# Altium footprint library Connectors THD.PcbLib: 631 footprints (part 8 of 46)
Each footprint in its own frame and in the unit in brackets; x right, y up, seen from the top. Pads: shape width x height; smd on the part's side, far side on the other; paste and mask are expansions set on the pad; w line width, h text height; cw(c..) or ccw(c..) is an arc to the next point about the centre after c.
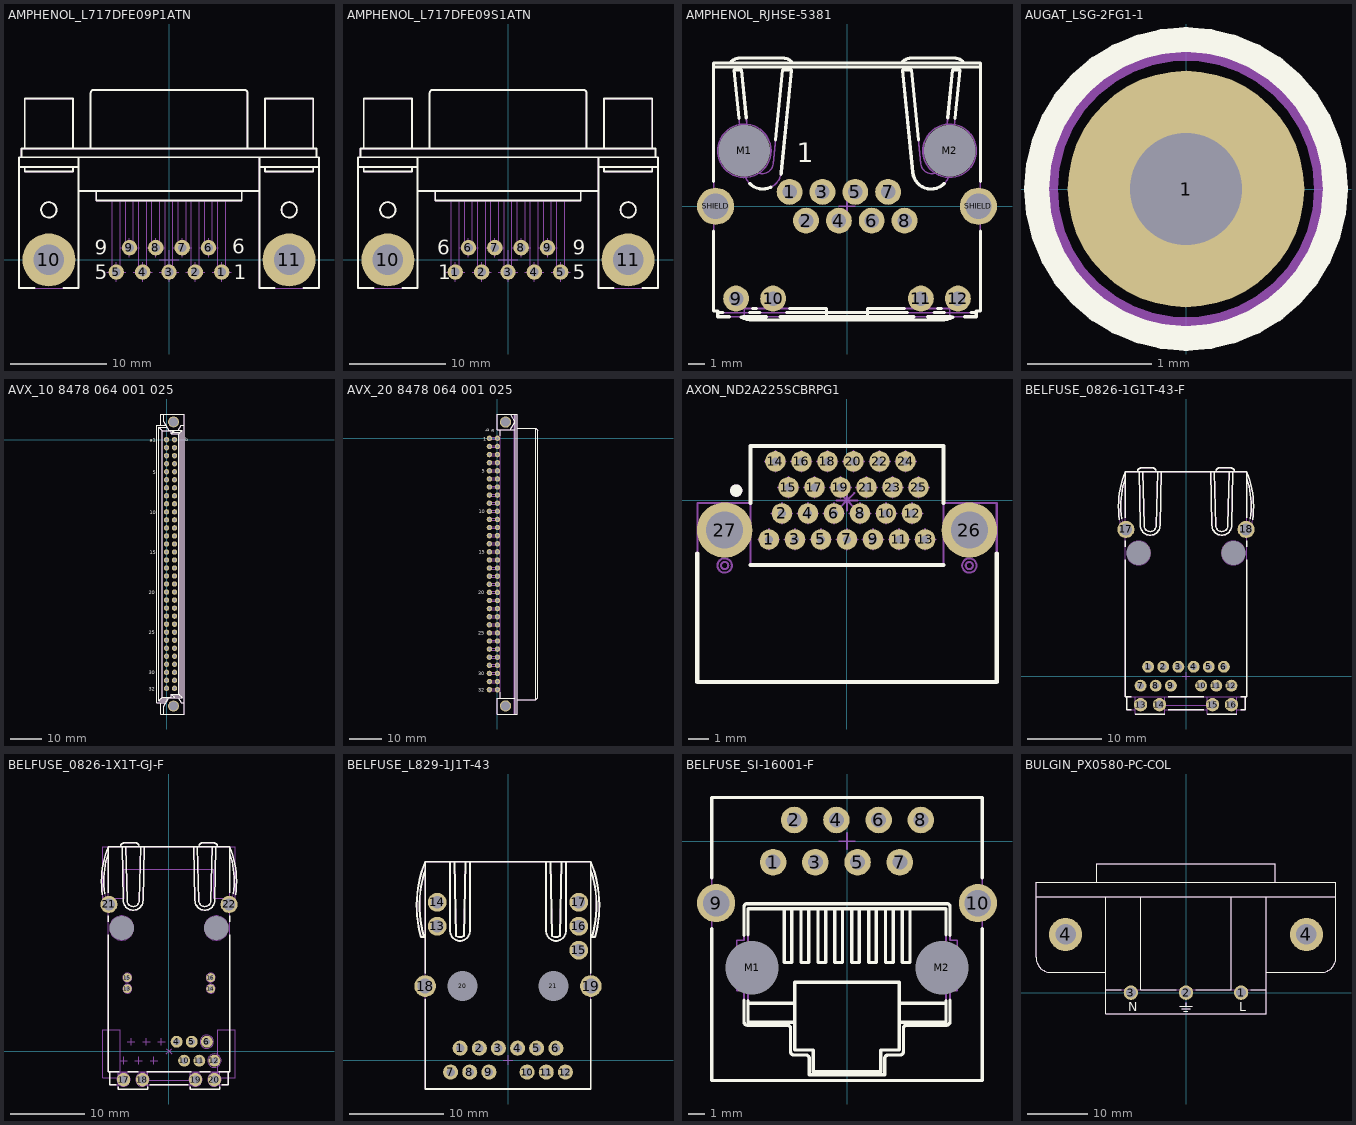
[diagram p7: the footprints below, top view; thin cyan lines are the x and y axes]

## AMPHENOL_L717DFE09P1ATN [mm] "Right Angled D-Sub 9 Male Contacts with Metal Bracket and Front Female Screwlock (UNC4-40)"
height 13.4
pads (11):
  round 1.6 hole 0.9: 1(5.48,-1.27) 2(2.74,-1.27) 3(0,-1.27) 4(-2.74,-1.27) 5(-5.48,-1.27) 6(4.11,1.27) 7(1.37,1.27) 8(-1.37,1.27) 9(-4.11,1.27)
  round 5.5 hole 3.2: 10(-12.495,0) 11(12.495,0)
Top Overlay:
  circle w0.2: c12.5,5.2 r0.8
  circle w0.2: c-12.5,5.2 r0.8
  lines w0.2: -15.35,10.67 -15.35,11.57 15.35,11.57 15.35,10.67 ; -15,9.67 -15,9.17 -10,9.17 -10,9.67 ; -15,11.57 -15,16.77 -10,16.77 -10,11.57 ; -14,-2.93 -15.6,-2.93 -15.6,10.67 15.6,10.67 15.6,-2.93 14,-2.93 ; -11,-2.93 -9.4,-2.93 -9.4,10.67 ; -9.539,9.67 -15.6,9.67 -9.4,9.67 ; -9.4,7.17 9.4,7.17 ; -8.142,11.57 -8.142,17.37 cw(c-7.842,17.37) -7.842,17.67 7.861,17.67 cw(c7.861,17.37) 8.161,17.37 8.161,11.57 ; -7.57,7.17 -7.57,6.17 7.57,6.17 7.57,7.17 ; 9.4,9.67 15.6,9.67 ; 9.4,10.67 9.4,-2.93 11,-2.93 ; 10,9.67 10,9.17 15,9.17 15,9.67 ; 10,11.57 10,16.77 15,16.77 15,11.57
  text "9" at -7.747,0.508 h1.5
  text "1" at 6.731,-2.032 h1.5
  text "5" at -7.747,-2.032 h1.5
  text "6" at 6.604,0.635 h1.5
Mechanical 8:
  lines w0.1: -13.5,0 -12.5,0 ; -12.5,-1 -12.5,0 ; -12.5,1 -12.5,0 ; -11.5,0 -12.5,0 ; -6.48,-1.27 -5.48,-1.27 ; -5.48,-2.27 -5.48,-1.27 ; -5.48,-0.27 -5.48,-1.27 ; -5.11,1.27 -4.11,1.27 ; -4.48,-1.27 -5.48,-1.27 ; -4.11,0.27 -4.11,1.27 ; -4.11,2.27 -4.11,1.27 ; -3.74,-1.27 -2.74,-1.27 ; -3.11,1.27 -4.11,1.27 ; -2.74,-2.27 -2.74,-1.27 ; -2.74,-0.27 -2.74,-1.27 ; -2.37,1.27 -1.37,1.27 ; -1.74,-1.27 -2.74,-1.27 ; -1.37,0.27 -1.37,1.27 ; -1.37,2.27 -1.37,1.27 ; -1,-1.27 0,-1.27 ; -1,0 0,0 ; -0.37,1.27 -1.37,1.27 ; 0,-2.27 0,-1.27 ; 0,-1 0,0 ; 0,-0.27 0,-1.27 ; 0,1 0,0 ; 0.37,1.27 1.37,1.27 ; 1,-1.27 0,-1.27 ; 1,0 0,0 ; 1.37,0.27 1.37,1.27 ; 1.37,2.27 1.37,1.27 ; 1.74,-1.27 2.74,-1.27 ; 2.37,1.27 1.37,1.27 ; 2.74,-2.27 2.74,-1.27 ; 2.74,-0.27 2.74,-1.27 ; 3.11,1.27 4.11,1.27 ; 3.74,-1.27 2.74,-1.27 ; 4.11,0.27 4.11,1.27 ; 4.11,2.27 4.11,1.27 ; 4.48,-1.27 5.48,-1.27 ; 5.11,1.27 4.11,1.27 ; 5.48,-2.27 5.48,-1.27 ; 5.48,-0.27 5.48,-1.27 ; 6.48,-1.27 5.48,-1.27 ; 11.5,0 12.5,0 ; 12.5,-1 12.5,0 ; 12.5,1 12.5,0 ; 13.5,0 12.5,0
Mechanical 14:
  circle w0.1: c12.5,0 r1.6
  circle w0.1: c12.5,5.2 r0.8
  circle w0.1: c-12.5,5.2 r0.8
  circle w0.1: c-12.5,0 r1.6
  lines w0.1: -15.35,10.67 -15.35,11.57 15.35,11.57 15.35,10.67 ; -15,9.67 -15,9.17 -10,9.17 -10,9.67 ; -15,11.57 -15,16.77 -10,16.77 -10,11.57 ; -9.539,9.67 -15.6,9.67 -9.4,9.67 ; -9.4,7.17 9.4,7.17 ; -9.4,10.67 -9.4,-2.93 -15.6,-2.93 -15.6,10.67 15.6,10.67 15.6,-2.93 9.4,-2.93 9.4,10.67 ; -8.142,11.57 -8.142,17.37 cw(c-7.842,17.37) -7.842,17.67 7.861,17.67 cw(c7.861,17.37) 8.161,17.37 8.161,11.57 ; -7.57,7.17 -7.57,6.17 7.57,6.17 7.57,7.17 ; -5.88,6.17 -5.88,-1.27 ccw(c-5.48,-1.27) -5.08,-1.27 -5.08,6.17 ; -4.51,6.17 -4.51,1.27 ccw(c-4.11,1.27) -3.71,1.27 -3.71,6.17 ; -3.14,6.17 -3.14,-1.27 ccw(c-2.74,-1.27) -2.34,-1.27 -2.34,6.17 ; -1.77,6.17 -1.77,1.27 ccw(c-1.37,1.27) -0.97,1.27 -0.97,6.17 ; -0.4,6.17 -0.4,-1.27 ccw(c0,-1.27) 0.4,-1.27 0.4,6.17 ; 0.97,6.17 0.97,1.27 ccw(c1.37,1.27) 1.77,1.27 1.77,6.17 ; 2.34,6.17 2.34,-1.27 ccw(c2.74,-1.27) 3.14,-1.27 3.14,6.17 ; 3.71,6.17 3.71,1.27 ccw(c4.11,1.27) 4.51,1.27 4.51,6.17 ; 5.08,6.17 5.08,-1.27 ccw(c5.48,-1.27) 5.88,-1.27 5.88,6.17 ; 9.4,9.67 15.6,9.67 ; 10,9.67 10,9.17 15,9.17 15,9.67 ; 10,11.57 10,16.77 15,16.77 15,11.57
3D body: height 13.45, standoff -3.95, extent -15.6,-2.93 15.6,17.67

## AMPHENOL_L717DFE09S1ATN [mm] "Right Angled D-Sub 9 Female Contacts with Metal Bracket and Front Female Screwlock (UNC4-40)"
height 13.4
pads (11):
  round 1.6 hole 0.9: 1(-5.48,-1.27) 2(-2.74,-1.27) 3(0,-1.27) 4(2.74,-1.27) 5(5.48,-1.27) 6(-4.11,1.27) 7(-1.37,1.27) 8(1.37,1.27) 9(4.11,1.27)
  round 5.5 hole 3.2: 10(-12.495,0) 11(12.495,0)
Top Overlay:
  circle w0.2: c12.5,5.2 r0.8
  circle w0.2: c-12.5,5.2 r0.8
  lines w0.2: -15.35,10.67 -15.35,11.57 15.35,11.57 15.35,10.67 ; -15,9.67 -15,9.17 -10,9.17 -10,9.67 ; -15,11.57 -15,16.77 -10,16.77 -10,11.57 ; -14,-2.93 -15.6,-2.93 -15.6,10.67 15.6,10.67 15.6,-2.93 14,-2.93 ; -11,-2.93 -9.4,-2.93 -9.4,10.67 ; -9.539,9.67 -15.6,9.67 -9.4,9.67 ; -9.4,7.17 9.4,7.17 ; -8.142,11.57 -8.142,17.37 cw(c-7.842,17.37) -7.842,17.67 7.861,17.67 cw(c7.861,17.37) 8.161,17.37 8.161,11.57 ; -7.57,7.17 -7.57,6.17 7.57,6.17 7.57,7.17 ; 9.4,9.67 15.6,9.67 ; 9.4,10.67 9.4,-2.93 11,-2.93 ; 10,9.67 10,9.17 15,9.17 15,9.67 ; 10,11.57 10,16.77 15,16.77 15,11.57
  text "6" at -7.366,0.508 h1.5
  text "5" at 6.731,-2.032 h1.5
  text "1" at -7.239,-2.032 h1.5
  text "9" at 6.731,0.508 h1.5
Mechanical 8:
  lines w0.1: -13.5,0 -12.5,0 ; -12.5,-1 -12.5,0 ; -12.5,1 -12.5,0 ; -11.5,0 -12.5,0 ; -6.48,-1.27 -5.48,-1.27 ; -5.48,-2.27 -5.48,-1.27 ; -5.48,-0.27 -5.48,-1.27 ; -5.11,1.27 -4.11,1.27 ; -4.48,-1.27 -5.48,-1.27 ; -4.11,0.27 -4.11,1.27 ; -4.11,2.27 -4.11,1.27 ; -3.74,-1.27 -2.74,-1.27 ; -3.11,1.27 -4.11,1.27 ; -2.74,-2.27 -2.74,-1.27 ; -2.74,-0.27 -2.74,-1.27 ; -2.37,1.27 -1.37,1.27 ; -1.74,-1.27 -2.74,-1.27 ; -1.37,0.27 -1.37,1.27 ; -1.37,2.27 -1.37,1.27 ; -1,-1.27 0,-1.27 ; -1,0 0,0 ; -0.37,1.27 -1.37,1.27 ; 0,-2.27 0,-1.27 ; 0,-1 0,0 ; 0,-0.27 0,-1.27 ; 0,1 0,0 ; 0.37,1.27 1.37,1.27 ; 1,-1.27 0,-1.27 ; 1,0 0,0 ; 1.37,0.27 1.37,1.27 ; 1.37,2.27 1.37,1.27 ; 1.74,-1.27 2.74,-1.27 ; 2.37,1.27 1.37,1.27 ; 2.74,-2.27 2.74,-1.27 ; 2.74,-0.27 2.74,-1.27 ; 3.11,1.27 4.11,1.27 ; 3.74,-1.27 2.74,-1.27 ; 4.11,0.27 4.11,1.27 ; 4.11,2.27 4.11,1.27 ; 4.48,-1.27 5.48,-1.27 ; 5.11,1.27 4.11,1.27 ; 5.48,-2.27 5.48,-1.27 ; 5.48,-0.27 5.48,-1.27 ; 6.48,-1.27 5.48,-1.27 ; 11.5,0 12.5,0 ; 12.5,-1 12.5,0 ; 12.5,1 12.5,0 ; 13.5,0 12.5,0
Mechanical 14:
  circle w0.1: c12.5,0 r1.6
  circle w0.1: c12.5,5.2 r0.8
  circle w0.1: c-12.5,5.2 r0.8
  circle w0.1: c-12.5,0 r1.6
  lines w0.1: -15.35,10.67 -15.35,11.57 15.35,11.57 15.35,10.67 ; -15,9.67 -15,9.17 -10,9.17 -10,9.67 ; -15,11.57 -15,16.77 -10,16.77 -10,11.57 ; -9.539,9.67 -15.6,9.67 -9.4,9.67 ; -9.4,7.17 9.4,7.17 ; -9.4,10.67 -9.4,-2.93 -15.6,-2.93 -15.6,10.67 15.6,10.67 15.6,-2.93 9.4,-2.93 9.4,10.67 ; -8.142,11.57 -8.142,17.37 cw(c-7.842,17.37) -7.842,17.67 7.861,17.67 cw(c7.861,17.37) 8.161,17.37 8.161,11.57 ; -7.57,7.17 -7.57,6.17 7.57,6.17 7.57,7.17 ; -5.88,6.17 -5.88,-1.27 ccw(c-5.48,-1.27) -5.08,-1.27 -5.08,6.17 ; -4.51,6.17 -4.51,1.27 ccw(c-4.11,1.27) -3.71,1.27 -3.71,6.17 ; -3.14,6.17 -3.14,-1.27 ccw(c-2.74,-1.27) -2.34,-1.27 -2.34,6.17 ; -1.77,6.17 -1.77,1.27 ccw(c-1.37,1.27) -0.97,1.27 -0.97,6.17 ; -0.4,6.17 -0.4,-1.27 ccw(c0,-1.27) 0.4,-1.27 0.4,6.17 ; 0.97,6.17 0.97,1.27 ccw(c1.37,1.27) 1.77,1.27 1.77,6.17 ; 2.34,6.17 2.34,-1.27 ccw(c2.74,-1.27) 3.14,-1.27 3.14,6.17 ; 3.71,6.17 3.71,1.27 ccw(c4.11,1.27) 4.51,1.27 4.51,6.17 ; 5.08,6.17 5.08,-1.27 ccw(c5.48,-1.27) 5.88,-1.27 5.88,6.17 ; 9.4,9.67 15.6,9.67 ; 10,9.67 10,9.17 15,9.17 15,9.67 ; 10,11.57 10,16.77 15,16.77 15,11.57
3D body: height 13.45, standoff -3.95, extent -15.6,-2.93 15.6,17.67

## AMPHENOL_RJHSE-5381 [mm] "1 Port, 8 Positions, CAT5 RJ45 Modular Connector With Yellow And Green LEDs"
height 13.46
pads (16):
  round 1.6 hole 0.9: 1(-3.554,0.886) 2(-2.538,-0.894) 3(-1.522,0.886) 4(-0.506,-0.894) 5(0.51,0.886) 6(1.526,-0.894) 7(2.542,0.886) 8(3.558,-0.894) 9(-6.862,-5.714) 10(-4.572,-5.714) 11(4.568,-5.714) 12(6.858,-5.714)
  round 1 hole 3.2 unplated mask+1.1: M1(-6.352,3.426) M2(6.348,3.426)
  round 2.3 hole 1.6: SHIELD(-8.132,-0.004) SHIELD(8.128,-0.004)
Top Overlay:
  lines w0.2: -8.257,-1.549 -8.257,-6.478 -8.003,-6.478 -8.003,-6.834 -7.293,-6.834 ; -8.257,1.541 -8.257,8.863 8.253,8.863 8.253,1.541 ; -8.257,8.609 8.253,8.609 ; -8.003,-6.58 -7.693,-6.58 ; -7.242,8.863 cw(c-6.621,8.379) -6.621,9.166 -3.979,9.166 cw(c-3.979,8.379) -3.358,8.863 ; -6.688,5.449 -6.987,8.432 -6.53,8.432 -6.233,5.473 ; -6.54,-6.87 ccw(c-5.844,-5.507) -5.844,-7.037 5.84,-7.037 ccw(c5.84,-5.507) 6.536,-6.87 ; -6.431,-6.834 -5.003,-6.834 ; -6.031,-6.58 -5.403,-6.58 ; -6.022,1.403 ccw(c-5.209,2.214) -4.719,1.176 ; -5.83,-6.326 -5.604,-6.326 ; -4.422,4.118 -3.99,8.432 -3.431,8.432 -4.066,2.1 cw(c-5.209,2.214) -4.089,1.961 ; -4.141,-6.834 4.137,-6.834 ; -3.741,-6.58 3.737,-6.58 ; -3.54,-6.326 -1.272,-6.326 -1.272,-6.834 ; 1.268,-6.834 1.268,-6.326 3.536,-6.326 ; 3.366,8.863 cw(c3.986,8.379) 3.986,9.166 6.628,9.166 cw(c6.628,8.379) 7.249,8.863 ; 4.418,4.118 3.986,8.432 3.427,8.432 4.062,2.1 ccw(c5.205,2.214) 6.018,1.403 ; 4.999,-6.834 6.427,-6.834 ; 5.399,-6.58 6.027,-6.58 ; 5.6,-6.326 5.826,-6.326 ; 6.229,5.473 6.526,8.432 6.983,8.432 6.684,5.449 ; 7.289,-6.834 7.999,-6.834 7.999,-6.478 8.253,-6.478 8.253,-1.549 ; 7.689,-6.58 7.999,-6.58
  text "1" at -3.12,2.725 h1.2
Mechanical 8:
  circle w0.1: c2.542,0.886 r0.45
  circle w0.1: c0.51,0.886 r0.45
  circle w0.1: c-1.522,0.886 r0.45
  circle w0.1: c-3.554,0.886 r0.45
  circle w0.1: c-2.538,-0.894 r0.45
  circle w0.1: c-0.506,-0.894 r0.45
  circle w0.1: c1.526,-0.894 r0.45
  circle w0.1: c3.558,-0.894 r0.45
  circle w0.1: c-8.132,-0.004 r0.8
  circle w0.1: c8.128,-0.004 r0.8
  circle w0.1: c-6.352,3.426 r1.65
  circle w0.1: c6.348,3.426 r1.65
  lines w0.1: -8.632,-0.004 -8.132,-0.004 ; -8.132,-0.504 -8.132,-0.004 ; -8.132,0.496 -8.132,-0.004 ; -7.632,-0.004 -8.132,-0.004 ; -7.362,-5.714 -6.862,-5.714 ; -6.862,-6.214 -6.862,-5.714 ; -6.862,-5.214 -6.862,-5.714 ; -6.852,3.426 -6.352,3.426 ; -6.362,-5.714 -6.862,-5.714 ; -6.352,2.926 -6.352,3.426 ; -6.352,3.926 -6.352,3.426 ; -5.852,3.426 -6.352,3.426 ; -5.072,-5.714 -4.572,-5.714 ; -4.572,-6.214 -4.572,-5.714 ; -4.572,-5.214 -4.572,-5.714 ; -4.072,-5.714 -4.572,-5.714 ; -4.054,0.886 -3.554,0.886 ; -3.554,0.386 -3.554,0.886 ; -3.554,1.386 -3.554,0.886 ; -3.054,0.886 -3.554,0.886 ; -3.038,-0.894 -2.538,-0.894 ; -2.538,-1.394 -2.538,-0.894 ; -2.538,-0.394 -2.538,-0.894 ; -2.038,-0.894 -2.538,-0.894 ; -2.022,0.886 -1.522,0.886 ; -1.522,0.386 -1.522,0.886 ; -1.522,1.386 -1.522,0.886 ; -1.022,0.886 -1.522,0.886 ; -1.006,-0.894 -0.506,-0.894 ; -0.506,-1.394 -0.506,-0.894 ; -0.506,-0.394 -0.506,-0.894 ; -0.5,0 0,0 ; -0.006,-0.894 -0.506,-0.894 ; 0,-0.5 0,0 ; 0,0.5 0,0 ; 0.01,0.886 0.51,0.886 ; 0.5,0 0,0 ; 0.51,0.386 0.51,0.886 ; 0.51,1.386 0.51,0.886 ; 1.01,0.886 0.51,0.886 ; 1.026,-0.894 1.526,-0.894 ; 1.526,-1.394 1.526,-0.894 ; 1.526,-0.394 1.526,-0.894 ; 2.026,-0.894 1.526,-0.894 ; 2.042,0.886 2.542,0.886 ; 2.542,0.386 2.542,0.886 ; 2.542,1.386 2.542,0.886 ; 3.042,0.886 2.542,0.886 ; 3.058,-0.894 3.558,-0.894 ; 3.558,-1.394 3.558,-0.894 ; 3.558,-0.394 3.558,-0.894 ; 4.058,-0.894 3.558,-0.894 ; 4.068,-5.714 4.568,-5.714 ; 4.568,-6.214 4.568,-5.714 ; 4.568,-5.214 4.568,-5.714 ; 5.068,-5.714 4.568,-5.714 ; 5.848,3.426 6.348,3.426 ; 6.348,2.926 6.348,3.426 ; 6.348,3.926 6.348,3.426 ; 6.358,-5.714 6.858,-5.714 ; 6.848,3.426 6.348,3.426 ; 6.858,-6.214 6.858,-5.714 ; 6.858,-5.214 6.858,-5.714 ; 7.358,-5.714 6.858,-5.714 ; 7.628,-0.004 8.128,-0.004 ; 8.128,-0.504 8.128,-0.004 ; 8.128,0.496 8.128,-0.004 ; 8.628,-0.004 8.128,-0.004
Mechanical 14:
  lines w0.1: -8.257,-0.408 cw(c-7.884,-0.027) -8.257,0.354 ; -8.257,8.609 8.253,8.609 ; -8.003,-6.58 7.999,-6.58 ; -7.242,8.863 cw(c-6.621,8.379) -6.621,9.166 -3.979,9.166 cw(c-3.979,8.379) -3.358,8.863 ; -6.606,-6.834 ccw(c-5.844,-5.507) -5.844,-7.037 5.84,-7.037 ccw(c5.84,-5.507) 6.602,-6.834 ; -6.352,-6.834 -6.352,-6.326 -1.272,-6.326 -1.272,-6.834 ; 1.268,-6.834 1.268,-6.326 6.348,-6.326 6.348,-6.834 ; 3.366,8.863 cw(c3.986,8.379) 3.986,9.166 6.628,9.166 cw(c6.628,8.379) 7.249,8.863 ; 8.253,-0.408 ccw(c7.88,-0.027) 8.253,0.354 ; -8.257,-6.478 -8.257,8.863 8.253,8.863 8.253,-6.478 7.999,-6.478 7.999,-6.834 -8.003,-6.834 -8.003,-6.478 -8.257,-6.478 ; -6.987,8.432 -6.53,8.432 -5.948,2.63 ccw(c-5.26,2.697) -4.572,2.63 -3.99,8.432 -3.431,8.432 -4.066,2.1 cw(c-5.209,2.214) -6.352,2.1 -6.987,8.432 ; 3.427,8.432 3.986,8.432 4.568,2.63 ccw(c5.256,2.697) 5.944,2.63 6.526,8.432 6.983,8.432 6.348,2.1 cw(c5.205,2.214) 4.062,2.1 3.427,8.432
  text "1" at -3.12,2.725 h1.2
3D body: height 15.14, standoff -3.7, extent -8.417,-7.037 8.413,9.166

## AUGAT_LSG-2FG1-1 [mm] "Single Lead Socket - Wire-Wrap Termination"
height 7.7
pads (1):
  round 1.9 / inner round 1.5 / far side round 1.5 hole 0.9: 1(0,0)
Top Overlay:
  circle w0.2: c0,0 r1.2
Mechanical 14:
  circle w0.1: c0,0 r1.08
Mechanical 15:
  circle w0.05: c0,0 r1.205
3D body: height 7.72, standoff -12.93, extent -1.079,-1.079 1.08,1.08

## AVX_10 8478 064 001 025 [mm] "DIN 41612, Type Q, Thru-Hole Press-Fit Terminations; Rows a+b, 64 Position, Performance level 2, Lead 5.3mm, Straight Male Connector"
height 11.48
pads (66):
  round 1.7 hole 1: a1(0,0) a2(0,-2.54) a3(0,-5.08) a4(0,-7.62) a5(0,-10.16) a6(0,-12.7) a7(0,-15.24) a8(0,-17.78) a9(0,-20.32) a10(0,-22.86) a11(0,-25.4) a12(0,-27.94) a13(0,-30.48) a14(0,-33.02) a15(0,-35.56) a16(0,-38.1) a17(0,-40.64) a18(0,-43.18) a19(0,-45.72) a20(0,-48.26) a21(0,-50.8) a22(0,-53.34) a23(0,-55.88) a24(0,-58.42) a25(0,-60.96) a26(0,-63.5) a27(0,-66.04) a28(0,-68.58) a29(0,-71.12) a30(0,-73.66) a31(0,-76.2) a32(0,-78.74) b1(2.54,0) b2(2.54,-2.54) b3(2.54,-5.08) b4(2.54,-7.62) b5(2.54,-10.16) b6(2.54,-12.7) b7(2.54,-15.24) b8(2.54,-17.78) b9(2.54,-20.32) b10(2.54,-22.86) b11(2.54,-25.4) b12(2.54,-27.94) b13(2.54,-30.48) b14(2.54,-33.02) b15(2.54,-35.56) b16(2.54,-38.1) b17(2.54,-40.64) b18(2.54,-43.18) b19(2.54,-45.72) b20(2.54,-48.26) b21(2.54,-50.8) b22(2.54,-53.34) b23(2.54,-55.88) b24(2.54,-58.42) b25(2.54,-60.96) b26(2.54,-63.5) b27(2.54,-66.04) b28(2.54,-68.58) b29(2.54,-71.12) b30(2.54,-73.66) b31(2.54,-76.2) b32(2.54,-78.74)
  round 3.5 / inner round 3.5 / far side round 5.1 hole 2.8: MTG1(2.24,5.63) MTG2(2.24,-84.37)
Top Overlay:
  lines w0.2: -1.83,-83.32 -1.83,-86.87 5.57,-86.87 5.57,8.13 -1.83,8.13 -1.83,4.58 ; -1.83,-81.97 0.576,-81.97 ; -0.81,-86.87 -0.81,-84.37 0.749,-81.67 5.02,-81.67 ; -0.81,8.13 -0.81,5.63 0.749,2.93 5.02,2.93 ; -0.204,-83.32 -3.03,-83.32 -3.03,4.58 -0.204,4.58 ; 0.2,-82.62 -2.48,-82.62 ; 0.2,3.88 -2.48,3.88 ; 1.97,-81.02 4.37,-81.02 4.37,2.28 1.97,2.28 1.97,2.93 ; 2.62,-81.67 1.52,-80.57 ; 2.62,2.93 1.52,1.83 ; 3.731,-81.67 4.684,-83.32 5.57,-83.323 ; 3.731,2.93 4.684,4.58 5.57,4.58 ; -2.48,-82.62 -2.48,3.88 ; -2.48,-82.62 -1.38,-81.52 ; -2.48,3.88 -1.38,2.78 ; -1.38,-81.52 -1.38,2.78 ; -1.38,-81.52 1.52,-81.52 1.52,-80.57 ; -1.38,2.78 1.52,2.78 1.52,1.83 ; 1.52,-80.57 3.92,-80.57 ; 1.52,1.83 3.92,1.83 ; 3.92,-80.57 3.92,1.83 ; 3.92,-80.57 5.02,-81.67 ; 3.92,1.83 5.02,2.93 ; 5.02,-81.67 5.02,2.93
  text "b" at 5.945,-0.574 h1.2
  text "32" at -5.575,-79.44 h1.2
  text "5" at -4.35,-10.91 h1.2
  text "10" at -5.275,-23.56 h1.2
  text "30" at -5.575,-74.36 h1.2
  text "25" at -5.575,-61.66 h1.2
  text "20" at -5.575,-48.96 h1.2
  text "15" at -5.275,-36.26 h1.2
  text "a1" at -5.325,-0.625 h1.2
Mechanical 8:
  drawing of 268 lines, arcs and shapes, not listed
Mechanical 14:
  circle w0.1: c2.24,5.63 r1.27
  circle w0.1: c2.24,-84.37 r1.27
  lines w0.1: -1.83,-83.32 -1.83,-86.87 5.57,-86.87 5.57,8.13 -1.83,8.13 -1.83,4.58 ; -1.83,-81.97 0.576,-81.97 ; -0.81,-86.87 -0.81,-84.37 0.749,-81.67 5.02,-81.67 ; -0.81,8.13 -0.81,5.63 0.749,2.93 5.02,2.93 ; -0.204,-83.32 -3.03,-83.32 -3.03,4.58 -0.204,4.58 ; 0.2,-82.62 -2.48,-82.62 ; 0.2,3.88 -2.48,3.88 ; 1.97,-81.02 4.37,-81.02 4.37,2.28 1.97,2.28 1.97,2.93 ; 2.62,-81.67 1.52,-80.57 ; 2.62,2.93 1.52,1.83 ; 3.731,-81.67 4.684,-83.32 5.57,-83.323 ; 3.731,2.93 4.684,4.58 5.57,4.58 ; -2.48,-82.62 -2.48,3.88 ; -2.48,-82.62 -1.38,-81.52 ; -2.48,3.88 -1.38,2.78 ; -1.38,-81.52 -1.38,2.78 ; -1.38,-81.52 1.52,-81.52 1.52,-80.57 ; -1.38,2.78 1.52,2.78 1.52,1.83 ; 1.52,-80.57 3.92,-80.57 ; 1.52,1.83 3.92,1.83 ; 3.92,-80.57 3.92,1.83 ; 3.92,-80.57 5.02,-81.67 ; 3.92,1.83 5.02,2.93 ; 5.02,-81.67 5.02,2.93
  text "a1" at -5.325,-0.625 h1.2
  text "b" at 5.945,-0.574 h1.2
  text "32" at -5.575,-79.44 h1.2
  text "5" at -4.35,-10.91 h1.2
  text "10" at -5.275,-23.56 h1.2
  text "15" at -5.275,-36.26 h1.2
  text "20" at -5.575,-48.96 h1.2
  text "25" at -5.575,-61.66 h1.2
  text "30" at -5.575,-74.36 h1.2
Drill Drawing:
  lines w0.1: 4.27,-57.71 4.27,-80.17 -1.71,-80.17 -1.71,1.43 4.37,1.43 4.37,-19.61
  text "PRESS-FIT TECHNOLOGY diam. 1mm +0.09 -0.06" at 5.34,-56.3 h1
3D body: height 11.6, standoff -5.3, extent -3.03,-86.87 5.57,8.13

## AVX_20 8478 064 001 025 [mm] "DIN 41612, Type Q, Thru-Hole Press-Fit Terminations; Rows a+b, 64 Position, Performance level 2, Lead 5.3mm, Right Angle Female Connector"
height 8
pads (66):
  round 1.7 hole 1: a1(0,0) a2(0,-2.54) a3(0,-5.08) a4(0,-7.62) a5(0,-10.16) a6(0,-12.7) a7(0,-15.24) a8(0,-17.78) a9(0,-20.32) a10(0,-22.86) a11(0,-25.4) a12(0,-27.94) a13(0,-30.48) a14(0,-33.02) a15(0,-35.56) a16(0,-38.1) a17(0,-40.64) a18(0,-43.18) a19(0,-45.72) a20(0,-48.26) a21(0,-50.8) a22(0,-53.34) a23(0,-55.88) a24(0,-58.42) a25(0,-60.96) a26(0,-63.5) a27(0,-66.04) a28(0,-68.58) a29(0,-71.12) a30(0,-73.66) a31(0,-76.2) a32(0,-78.74) b1(-2.54,0) b2(-2.54,-2.54) b3(-2.54,-5.08) b4(-2.54,-7.62) b5(-2.54,-10.16) b6(-2.54,-12.7) b7(-2.54,-15.24) b8(-2.54,-17.78) b9(-2.54,-20.32) b10(-2.54,-22.86) b11(-2.54,-25.4) b12(-2.54,-27.94) b13(-2.54,-30.48) b14(-2.54,-33.02) b15(-2.54,-35.56) b16(-2.54,-38.1) b17(-2.54,-40.64) b18(-2.54,-43.18) b19(-2.54,-45.72) b20(-2.54,-48.26) b21(-2.54,-50.8) b22(-2.54,-53.34) b23(-2.54,-55.88) b24(-2.54,-58.42) b25(-2.54,-60.96) b26(-2.54,-63.5) b27(-2.54,-66.04) b28(-2.54,-68.58) b29(-2.54,-71.12) b30(-2.54,-73.66) b31(-2.54,-76.2) b32(-2.54,-78.74)
  round 3.5 / inner round 3.5 / far side round 5.1 hole 2.8: MTG1(2.54,5.08) MTG2(2.54,-83.82)
Top Overlay:
  lines w0.2: 0.94,-81.37 0.94,-79.564 ; 0.94,0.824 0.94,2.63 ; 3.955,7.63 5.427,5.08 4.012,2.63 ; 5.59,-86.37 5.59,7.63 ; 5.59,-81.37 -0.06,-81.37 -0.06,-86.37 6.19,-86.37 6.19,7.63 -0.06,7.63 -0.06,2.63 5.59,2.63 ; 6.19,-81.87 12.04,-81.87 ; 6.19,3.13 12.04,3.13 ; 12.04,-81.87 12.64,-81.27 12.64,2.53 12.04,3.13 ; 12.04,-81.87 12.04,3.13
  text "1" at -4.505,-0.725 h1.2
  text "b" at -2.65,2.025 h1.2
  text "a" at -0.95,1.99 h1.2
  text "32" at -5.955,-79.365 h1.2
  text "5" at -4.855,-10.785 h1.2
  text "10" at -5.83,-23.535 h1.2
  text "15" at -5.83,-36.235 h1.2
  text "20" at -6.055,-48.81 h1.2
  text "25" at -6,-61.575 h1.2
  text "30" at -5.98,-74.285 h1.2
Mechanical 8:
  drawing of 266 lines, arcs and shapes, not listed
  text "PCB" at 5.08,-41.275 h1.2
Mechanical 14:
  circle w0.1: c2.54,5.08 r1.27
  circle w0.1: c2.54,-83.82 r1.27
  lines w0.1: 0.94,-81.37 0.94,2.63 ; 0.94,-79.04 -2.84,-79.04 -2.84,-78.44 0.94,-78.44 ; 0.94,-76.5 -2.84,-76.5 -2.84,-75.9 0.94,-75.9 ; 0.94,-73.96 -2.84,-73.96 -2.84,-73.36 0.94,-73.36 ; 0.94,-71.42 -2.84,-71.42 -2.84,-70.82 0.94,-70.82 ; 0.94,-68.88 -2.84,-68.88 -2.84,-68.28 0.94,-68.28 ; 0.94,-66.34 -2.84,-66.34 -2.84,-65.74 0.94,-65.74 ; 0.94,-63.8 -2.84,-63.8 -2.84,-63.2 0.94,-63.2 ; 0.94,-61.26 -2.84,-61.26 -2.84,-60.66 0.94,-60.66 ; 0.94,-58.72 -2.84,-58.72 -2.84,-58.12 0.94,-58.12 ; 0.94,-56.18 -2.84,-56.18 -2.84,-55.58 0.94,-55.58 ; 0.94,-53.64 -2.84,-53.64 -2.84,-53.04 0.94,-53.04 ; 0.94,-51.1 -2.84,-51.1 -2.84,-50.5 0.94,-50.5 ; 0.94,-48.56 -2.84,-48.56 -2.84,-47.96 0.94,-47.96 ; 0.94,-46.02 -2.84,-46.02 -2.84,-45.42 0.94,-45.42 ; 0.94,-43.48 -2.84,-43.48 -2.84,-42.88 0.94,-42.88 ; 0.94,-40.94 -2.84,-40.94 -2.84,-40.34 0.94,-40.34 ; 0.94,-38.4 -2.84,-38.4 -2.84,-37.8 0.94,-37.8 ; 0.94,-35.86 -2.84,-35.86 -2.84,-35.26 0.94,-35.26 ; 0.94,-33.32 -2.84,-33.32 -2.84,-32.72 0.94,-32.72 ; 0.94,-30.78 -2.84,-30.78 -2.84,-30.18 0.94,-30.18 ; 0.94,-28.24 -2.84,-28.24 -2.84,-27.64 0.94,-27.64 ; 0.94,-25.7 -2.84,-25.7 -2.84,-25.1 0.94,-25.1 ; 0.94,-23.16 -2.84,-23.16 -2.84,-22.56 0.94,-22.56 ; 0.94,-20.62 -2.84,-20.62 -2.84,-20.02 0.94,-20.02 ; 0.94,-18.08 -2.84,-18.08 -2.84,-17.48 0.94,-17.48 ; 0.94,-15.54 -2.84,-15.54 -2.84,-14.94 0.94,-14.94 ; 0.94,-13 -2.84,-13 -2.84,-12.4 0.94,-12.4 ; 0.94,-10.46 -2.84,-10.46 -2.84,-9.86 0.94,-9.86 ; 0.94,-7.92 -2.84,-7.92 -2.84,-7.32 0.94,-7.32 ; 0.94,-5.38 -2.84,-5.38 -2.84,-4.78 0.94,-4.78 ; 0.94,-2.84 -2.84,-2.84 -2.84,-2.24 0.94,-2.24 ; 0.94,-0.3 -2.84,-0.3 -2.84,0.3 0.94,0.3 ; 3.955,7.63 5.427,5.08 4.012,2.63 ; 5.59,-86.37 5.59,7.63 ; 5.59,-81.37 -0.06,-81.37 -0.06,-86.37 6.19,-86.37 6.19,7.63 -0.06,7.63 -0.06,2.63 5.59,2.63 ; 6.19,-81.87 12.04,-81.87 ; 6.19,3.13 12.04,3.13 ; 12.04,-81.87 12.64,-81.27 12.64,2.53 12.04,3.13 ; 12.04,-81.87 12.04,3.13
  text "a" at -0.95,1.99 h1.2
  text "b" at -2.65,2.025 h1.2
  text "32" at -5.955,-79.365 h1.2
  text "10" at -5.83,-23.535 h1.2
  text "20" at -6.055,-48.81 h1.2
  text "30" at -5.98,-74.285 h1.2
  text "1" at -4.505,-0.725 h1.2
  text "5" at -4.855,-10.785 h1.2
Drill Drawing:
  lines w0.1: 1.73,-57.71 1.73,-80.17 -4.25,-80.17 -4.25,1.43 1.83,1.43 1.83,-19.61
  text "PRESS-FIT TECHNOLOGY diam. 1mm +0.09 -0.06" at 2.8,-56.3 h1
3D body: height 6.78, standoff -5.3, extent -2.84,-86.37 12.64,7.63

## AXON_ND2A225SCBRPG1 [mm] "AXON Nano-D 2 Row Right Angle PCB Receptacle With Threaded Hole #0-80 UNF"
height 3.82
pads (27):
  round 1 hole 0.4: 1(-3.81,-1.905) 2(-3.175,-0.635) 3(-2.54,-1.905) 4(-1.905,-0.635) 5(-1.27,-1.905) 6(-0.635,-0.635) 7(0,-1.905) 8(0.635,-0.635) 9(1.27,-1.905) 10(1.905,-0.635) 11(2.54,-1.905) 12(3.175,-0.635) 13(3.81,-1.905) 14(-3.493,1.905) 15(-2.858,0.635) 16(-2.222,1.905) 17(-1.587,0.635) 18(-0.953,1.905) 19(-0.318,0.635) 20(0.318,1.905) 21(0.953,0.635) 22(1.587,1.905) 23(2.222,0.635) 24(2.858,1.905) 25(3.493,0.635)
  round 2.7 hole 1.8: 26(5.969,-1.448) 27(-5.968,-1.448)
Top Overlay:
  circle w0.3: c-5.408,0.478 r0.15
  lines w0.2: -7.304,-2.6 -7.304,-8.868 7.306,-8.868 7.306,-2.6 ; -4.704,-3.148 4.701,-3.148 ; -4.699,-0.128 -4.699,2.662 ; 4.701,-0.128 4.701,2.662 ; -4.699,2.662 4.701,2.662 ; -4.699,2.662 4.701,2.662
Mechanical 8:
  circle w0.1: c-5.968,-1.448 r0.9
  circle w0.1: c5.969,-1.448 r0.9
  lines w0.1: -6.468,-1.448 -5.968,-1.448 ; -5.968,-1.948 -5.968,-1.448 ; -5.968,-0.948 -5.968,-1.448 ; -5.468,-1.448 -5.968,-1.448 ; -4.31,-1.905 -3.81,-1.905 ; -3.993,1.905 -3.493,1.905 ; -3.81,-2.405 -3.81,-1.905 ; -3.81,-1.405 -3.81,-1.905 ; -3.675,-0.635 -3.175,-0.635 ; -3.493,1.405 -3.493,1.905 ; -3.493,2.405 -3.493,1.905 ; -3.358,0.635 -2.858,0.635 ; -3.31,-1.905 -3.81,-1.905 ; -3.175,-1.135 -3.175,-0.635 ; -3.175,-0.135 -3.175,-0.635 ; -3.04,-1.905 -2.54,-1.905 ; -2.993,1.905 -3.493,1.905 ; -2.858,0.135 -2.858,0.635 ; -2.858,1.135 -2.858,0.635 ; -2.723,1.905 -2.222,1.905 ; -2.675,-0.635 -3.175,-0.635 ; -2.54,-2.405 -2.54,-1.905 ; -2.54,-1.405 -2.54,-1.905 ; -2.405,-0.635 -1.905,-0.635 ; -2.358,0.635 -2.858,0.635 ; -2.222,1.405 -2.222,1.905 ; -2.222,2.405 -2.222,1.905 ; -2.088,0.635 -1.587,0.635 ; -2.04,-1.905 -2.54,-1.905 ; -1.905,-1.135 -1.905,-0.635 ; -1.905,-0.135 -1.905,-0.635 ; -1.77,-1.905 -1.27,-1.905 ; -1.723,1.905 -2.222,1.905 ; -1.587,0.135 -1.587,0.635 ; -1.587,1.135 -1.587,0.635 ; -1.453,1.905 -0.953,1.905 ; -1.405,-0.635 -1.905,-0.635 ; -1.27,-2.405 -1.27,-1.905 ; -1.27,-1.405 -1.27,-1.905 ; -1.135,-0.635 -0.635,-0.635 ; -1.088,0.635 -1.587,0.635 ; -0.953,1.405 -0.953,1.905 ; -0.953,2.405 -0.953,1.905 ; -0.818,0.635 -0.318,0.635 ; -0.77,-1.905 -1.27,-1.905 ; -0.635,-1.135 -0.635,-0.635 ; -0.635,-0.135 -0.635,-0.635 ; -0.5,-1.905 0,-1.905 ; -0.5,0 0,0 ; -0.453,1.905 -0.953,1.905 ; -0.354,-0.354 0,0 ; -0.354,0.354 0,0 ; -0.318,0.135 -0.318,0.635 ; -0.318,1.135 -0.318,0.635 ; -0.183,1.905 0.318,1.905 ; -0.135,-0.635 -0.635,-0.635 ; 0,-2.405 0,-1.905 ; 0,-1.405 0,-1.905 ; 0,-0.5 0,0 ; 0,0.5 0,0 ; 0.135,-0.635 0.635,-0.635 ; 0.182,0.635 -0.318,0.635 ; 0.318,1.405 0.318,1.905 ; 0.318,2.405 0.318,1.905 ; 0.354,-0.354 0,0 ; 0.354,0.354 0,0 ; 0.453,0.635 0.953,0.635 ; 0.5,-1.905 0,-1.905 ; 0.5,0 0,0 ; 0.635,-1.135 0.635,-0.635 ; 0.635,-0.135 0.635,-0.635 ; 0.77,-1.905 1.27,-1.905 ; 0.818,1.905 0.318,1.905 ; 0.953,0.135 0.953,0.635 ; 0.953,1.135 0.953,0.635 ; 1.088,1.905 1.587,1.905 ; 1.135,-0.635 0.635,-0.635 ; 1.27,-2.405 1.27,-1.905 ; 1.27,-1.405 1.27,-1.905 ; 1.405,-0.635 1.905,-0.635 ; 1.453,0.635 0.953,0.635 ; 1.587,1.405 1.587,1.905 ; 1.587,2.405 1.587,1.905 ; 1.723,0.635 2.222,0.635 ; 1.77,-1.905 1.27,-1.905 ; 1.905,-1.135 1.905,-0.635 ; 1.905,-0.135 1.905,-0.635 ; 2.04,-1.905 2.54,-1.905 ; 2.088,1.905 1.587,1.905 ; 2.222,0.135 2.222,0.635 ; 2.222,1.135 2.222,0.635 ; 2.358,1.905 2.858,1.905 ; 2.405,-0.635 1.905,-0.635 ; 2.54,-2.405 2.54,-1.905 ; 2.54,-1.405 2.54,-1.905 ; 2.675,-0.635 3.175,-0.635 ; 2.723,0.635 2.222,0.635 ; 2.858,1.405 2.858,1.905 ; 2.858,2.405 2.858,1.905 ; 2.993,0.635 3.493,0.635 ; 3.04,-1.905 2.54,-1.905 ; 3.175,-1.135 3.175,-0.635 ; 3.175,-0.135 3.175,-0.635 ; 3.31,-1.905 3.81,-1.905 ; 3.358,1.905 2.858,1.905 ; 3.493,0.135 3.493,0.635 ; 3.493,1.135 3.493,0.635 ; 3.675,-0.635 3.175,-0.635 ; 3.81,-2.405 3.81,-1.905 ; 3.81,-1.405 3.81,-1.905 ; 3.993,0.635 3.493,0.635 ; 4.31,-1.905 3.81,-1.905 ; 5.469,-1.448 5.969,-1.448 ; 5.969,-1.948 5.969,-1.448 ; 5.969,-0.948 5.969,-1.448 ; 6.469,-1.448 5.969,-1.448